# Altium footprint library d1_PcbLib.PcbLib: 266 footprints (part 6 of 17)
Each footprint in its own frame and in the unit in brackets; x right, y up, seen from the top. Pads: shape width x height; smd on the part's side, far side on the other; paste and mask are expansions set on the pad; w line width, h text height; cw(c..) or ccw(c..) is an arc to the next point about the centre after c.
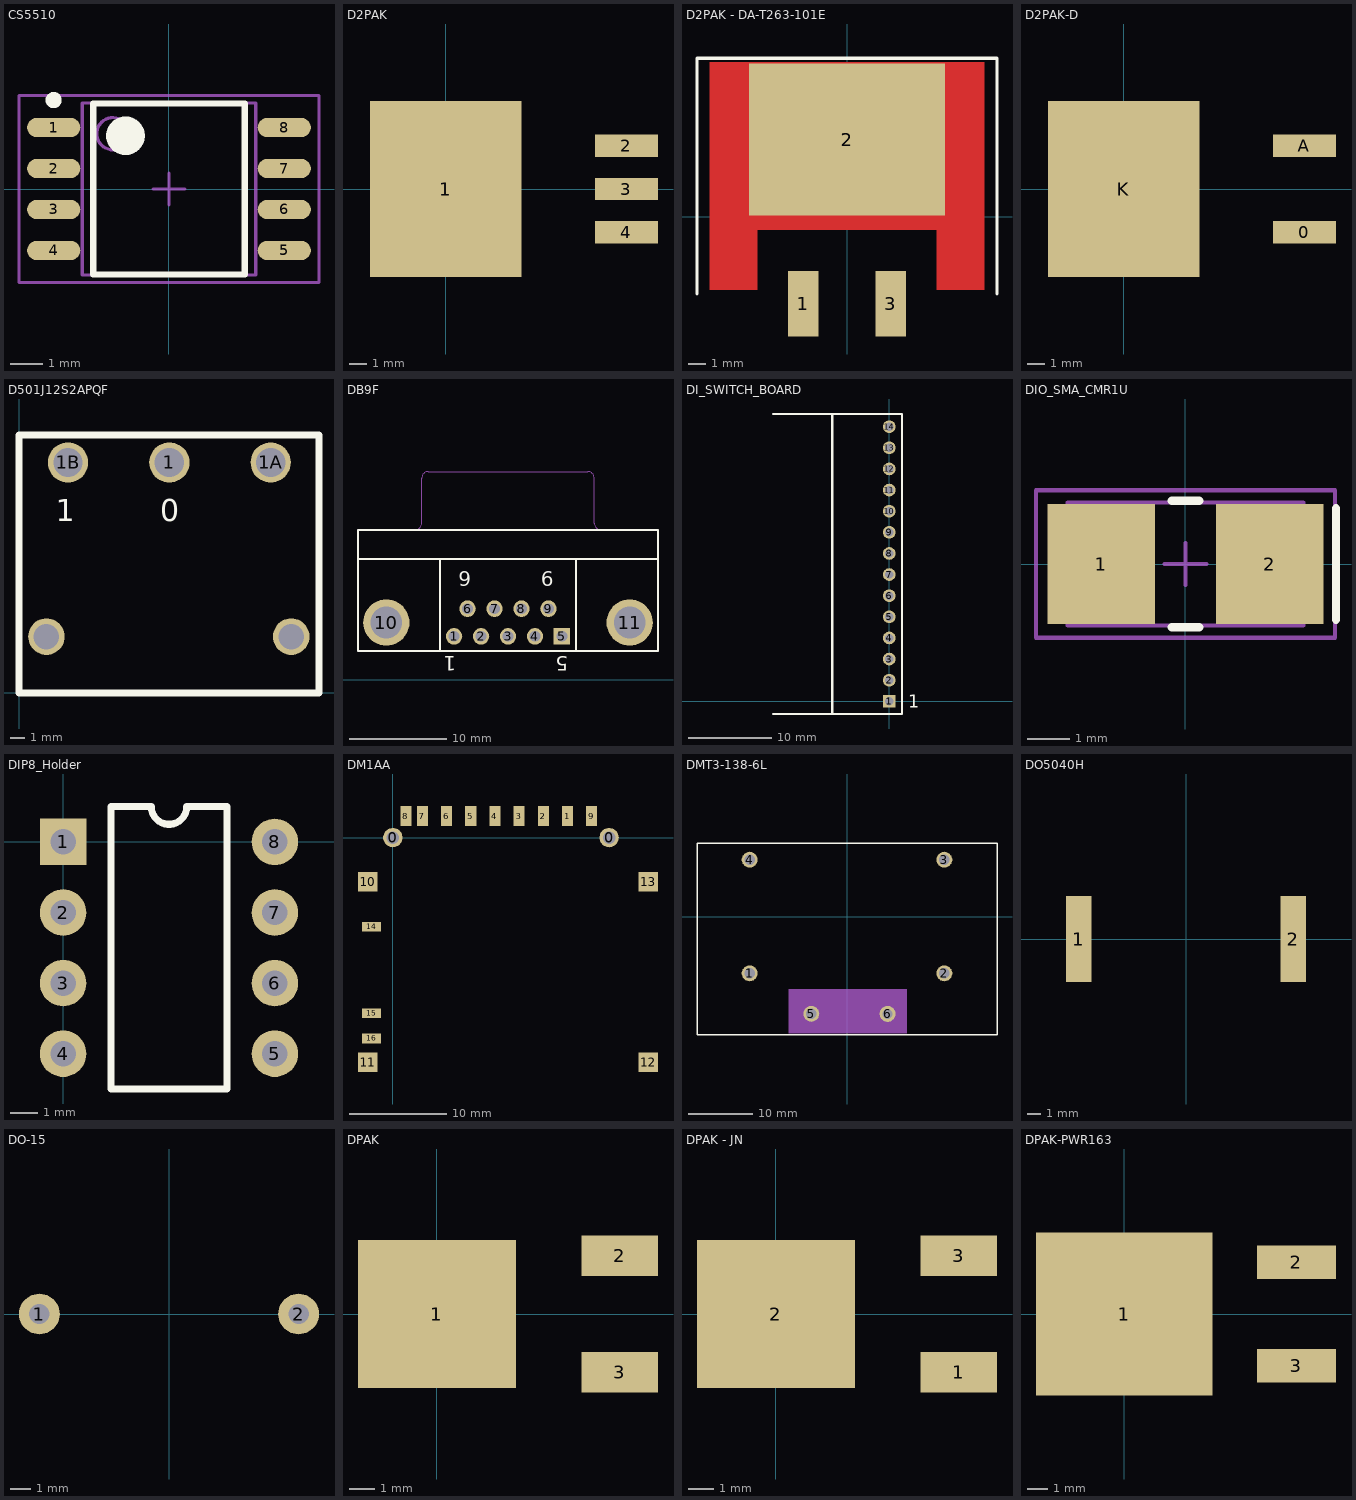
[diagram p5: the footprints below, top view; thin cyan lines are the x and y axes]

## CS5510 [mm]
height 2.13
pads (8):
  oval 1.65x0.6 smd: 1(-3.575,1.905) 2(-3.575,0.635) 3(-3.575,-0.635) 4(-3.575,-1.905) 5(3.575,-1.905) 6(3.575,-0.635) 7(3.575,0.635) 8(3.575,1.905)
Top Overlay:
  circle w0.25: c-3.575,2.755 r0.125
  circle w0.6: c-1.35,1.65 r0.3
  lines w0.2: -2.35,-2.65 -2.35,2.65 2.35,2.65 2.35,-2.65 -2.35,-2.65
Mechanical 13:
  circle w0.1: c-1.74,1.715 r0.5
  lines w0.1: -2.69,-2.665 -2.69,2.665 2.69,2.665 2.69,-2.665 -2.69,-2.665
Mechanical 15:
  lines w0.1: -0.5,0 0.5,0 ; 0,-0.5 0,0.5 ; -4.65,-2.9 -4.65,2.9 4.65,2.9 4.65,-2.9 -4.65,-2.9
3D body: height 2.13, standoff 0.1, extent -2.69,-2.665 2.69,2.665

## D2PAK [mm]
pads (4):
  rect 8.9x10.3 smd: 1(0,0)
  rect 3.7x1.3 smd: 2(10.6,2.54) 3(10.6,0) 4(10.6,-2.54)

## D2PAK - DA-T263-101E [mil] "D2-PAK/TO-263-AB; 3 Leads (1 Cropped); Body 15.5 (inc. leads) x 10.5 mm (LxW max)"
height 184.65
pads (3):
  rect 70x150 smd: 1(-100,-200) 3(100,-200)
  rect 450x350 smd: 2(0,177.17)
Top Layer:
  region: -314.96,354.33 -314.96,-167.32 -206.69,-167.32 -206.69,-29.53 206.69,-29.53 206.69,-167.32 314.96,-167.32 314.96,354.33
Top Overlay:
  lines w7.87: -344.49,-177.17 -344.49,364.17 344.49,364.17 344.49,-177.17
Top Solder:
  region: -316.93,356.3 -316.93,-169.29 -204.72,-169.29 -204.72,-31.5 204.72,-31.5 204.72,-169.29 316.93,-169.29 316.93,356.3
3D body: height 400, standoff 0, extent -510,-147.64 510,352.36
3D body: height 192.32, standoff -5.24, extent -200,-255.91 200,345.03

## D2PAK-D [mm]
pads (3):
  rect 3.7x1.3 smd: 0(10.6,-2.54) A(10.6,2.54)
  rect 8.9x10.3 smd: K(0,0)

## D501J12S2APQF [mil] "SWITCH ROCKER RIGHT ANGLE"
pads (5):
  round 110 hole 80: 1(411,630) 1A(688,630) 1B(134,630)
  round 100 hole 70: ""(75,154) ""(744,154)
Top Overlay:
  lines w20: 0,0 0,705 820,705 820,0 0,0
  text "1         0" at 100,470 h60
3D body: height 591, standoff 10, extent 0,0 820,565

## DB9F [mm]
pads (11):
  round 1.69 hole 1.09: 1(-24.244,4.449) 2(-21.474,4.449) 3(-18.704,4.449) 4(-15.934,4.449) 6(-22.859,7.289) 7(-20.089,7.289) 8(-17.319,7.289) 9(-14.549,7.289)
  rect 1.69x1.69 hole 1.09: 5(-13.164,4.449)
  round 4.76 hole 3.26: 10(-31.199,5.869) 11(-6.209,5.869)
Top Overlay:
  lines w0.2: -34.104,12.369 -3.304,12.369 ; -25.704,2.969 -25.704,12.369 ; -11.704,2.969 -11.704,12.369 ; -34.104,2.969 -34.104,15.369 -3.304,15.369 -3.304,2.969 -34.104,2.969
  text "9" at -14.021,11.151 h1.5
  text "5" at -12.497,2.388 h1.5
  text "1" at -24.003,2.413 h1.5
  text "6" at -22.454,11.125 h1.5
Mechanical 13:
  lines w0.1: -34.104,12.369 -3.304,12.369 ; -28.264,15.374 ccw(c-28.264,16.069) -27.569,16.069 ; -27.584,16.027 -27.584,20.701 ; -27.564,20.674 cw(c-26.869,20.674) -26.869,21.369 -10.539,21.369 cw(c-10.539,20.674) -9.844,20.674 ; -25.704,2.969 -25.704,12.369 ; -11.704,2.969 -11.704,12.369 ; -9.839,16.069 ccw(c-9.144,16.069) -9.144,15.374 ; -9.83,16.078 -9.83,20.65 ; -34.104,2.969 -3.304,2.969 -3.304,15.369 -34.104,15.369 -34.104,2.969
3D body: height 12.75, standoff -3.85, extent -34.12,2.916 -3.32,21.336

## DI_SWITCH_BOARD [mil]
pads (14):
  rect 60x60 hole 39: 1(0,0)
  round 60 hole 39: 2(0,100) 3(0,200) 4(0,300) 5(0,400) 6(0,500) 7(0,600) 8(0,700) 9(0,800) 10(0,900) 11(0,1000) 12(0,1100) 13(0,1200) 14(0,1300)
Top Overlay:
  lines w10: -550,-60 -270,-60 ; -550,1360 -270,1360 ; -270,-60 60,-60 60,1360 -270,1360 ; -270,-60 -270,1360
  text "1" at 90,-30 h60
3D body: height 272.5, standoff -230, extent -260,-50 50,1350
3D body: height 1185, standoff 0, extent -1376.02,-1849.99 -57,3150.01

## DIO_SMA_CMR1U [mm] "Molded Diode, 2-Leads, Body 5.2x2.6mm, IPC Medium Density"
height 2.62
pads (2):
  rect 2.55x2.85 smd: 1(-2,0) 2(2,0)
Top Overlay:
  lines w0.2: -0.325,-1.5 0.325,-1.5 ; -0.325,1.5 0.325,1.5 ; 3.575,-1.325 3.575,1.325
Mechanical 13:
  rectangle: 2.043,-1.46 2.795,1.46
  lines w0.1: -2.795,-1.46 2.795,-1.46 2.795,1.46 -2.795,1.46 -2.795,-1.46
Mechanical 15:
  lines w0.1: -0.5,0 0.5,0 ; 0,-0.5 0,0.5 ; -3.55,-1.75 3.55,-1.75 3.55,1.75 -3.55,1.75 -3.55,-1.75
3D body: height 2.62, standoff 0, extent -2.795,-1.46 2.795,1.46

## DIP8_Holder [mil]
pads (8):
  rect 66x66 hole 36: 1(0,0)
  round 66 hole 36: 2(0,-100) 3(0,-200) 4(0,-300) 5(300,-300) 6(300,-200) 7(300,-100) 8(300,0)
Top Overlay:
  lines w10: 68,-350 232,-350 232,50 175,50 cw(c150,50) 125,50 68,50 68,-350

## DM1AA [mm]
pads (18):
  round 2 hole 1.3: 0(0,0) 0(22.352,0)
  rect 1.14x2.05 smd mask+0.102: 1(18.05,2.225) 2(15.55,2.225) 3(13.05,2.225) 4(10.55,2.225) 5(8.05,2.225) 6(5.55,2.225) 7(3.05,2.225) 8(1.35,2.225) 9(20.55,2.225)
  rect 2x2 smd mask+0.102: 10(-2.6,-4.55) 11(-2.6,-23.2) 12(26.4,-23.2) 13(26.4,-4.55)
  rect 2x1 smd mask+0.102: 14(-2.2,-9.2) 15(-2.2,-18.15) 16(-2.2,-20.75)
3D body: height 2.9, standoff -0.55, extent -3.186,-27.94 26.814,2.56

## DMT3-138-6L [mm] "Inductor"
pads (6):
  round 2.5 hole 1.6: 1(-15.25,-8.9) 2(15.25,-8.9) 3(15.25,8.9) 4(-15.25,8.9) 5(-5.588,-15.24) 6(6.36,-15.25)
Top Overlay:
  lines w0.2: -23.5,-18.542 -4.708,-18.542 4.708,-18.542 23.5,-18.542 23.5,11.5 -23.5,11.5 -23.5,-18.542
Mechanical 1:
  region: -9.144,-11.43 9.398,-11.43 9.398,-18.288 -9.144,-18.288
3D body: height 48.28, standoff -5.6, extent -23.5,-11.43 23.5,11.43

## DO5040H [mm]
pads (2):
  rect 1.9x6.35 smd: 1(-7.95,0) 2(7.95,0)
3D body: height 12.04, standoff 0.04, extent -9.27,-7.493 9.27,7.239

## DO-15 [mm]
pads (2):
  round 2 hole 1: 1(-6.35,0) 2(6.35,0)
3D body: height 4.78, standoff -2, extent -6.78,-1.831 6.78,1.729

## DPAK [mm]
pads (3):
  rect 6.2x5.8 smd: 1(0,0)
  rect 3x1.6 smd: 2(7.18,2.285) 3(7.18,-2.285)
3D body: height 2.3, standoff 0, extent -2.693,-3.325 6.807,3.175

## DPAK - JN [mm]
pads (3):
  rect 3x1.6 smd: 1(7.18,-2.285) 3(7.18,2.285)
  rect 6.2x5.8 smd: 2(0,0)
3D body: height 2.3, standoff 0, extent -2.693,-3.325 6.807,3.175

## DPAK-PWR163 [mm]
height 2.79
pads (3):
  rect 8.51x7.87 smd: 1(0,0)
  rect 3.81x1.62 smd: 2(8.3,2.5) 3(8.3,-2.5)
3D body: height 2.79, standoff 0, extent -3,-4 4.3,4
3D body: height 0.81, standoff 0, extent -4.3,-3.2 -3,3.2
3D body: height 1.95, standoff 1.06, extent 4.29,2.087 6.56,2.975
3D body: height 1.95, standoff -0.09, extent 5.879,2.1 7.921,2.988
3D body: height 0.5, standoff 0, extent 6.938,2.025 9.513,3.075
3D body: height 0.5, standoff 0, extent 6.938,-2.95 9.513,-1.9
3D body: height 1.95, standoff -0.09, extent 5.879,-2.875 7.921,-1.987
3D body: height 1.95, standoff 1.06, extent 4.29,-2.888 6.56,-2